# Altium footprint library Isengard.PcbLib: 150 footprints (part 9 of 10)
Each footprint in its own frame and in the unit in brackets; x right, y up, seen from the top. Pads: shape width x height; smd on the part's side, far side on the other; paste and mask are expansions set on the pad; w line width, h text height; cw(c..) or ccw(c..) is an arc to the next point about the centre after c.
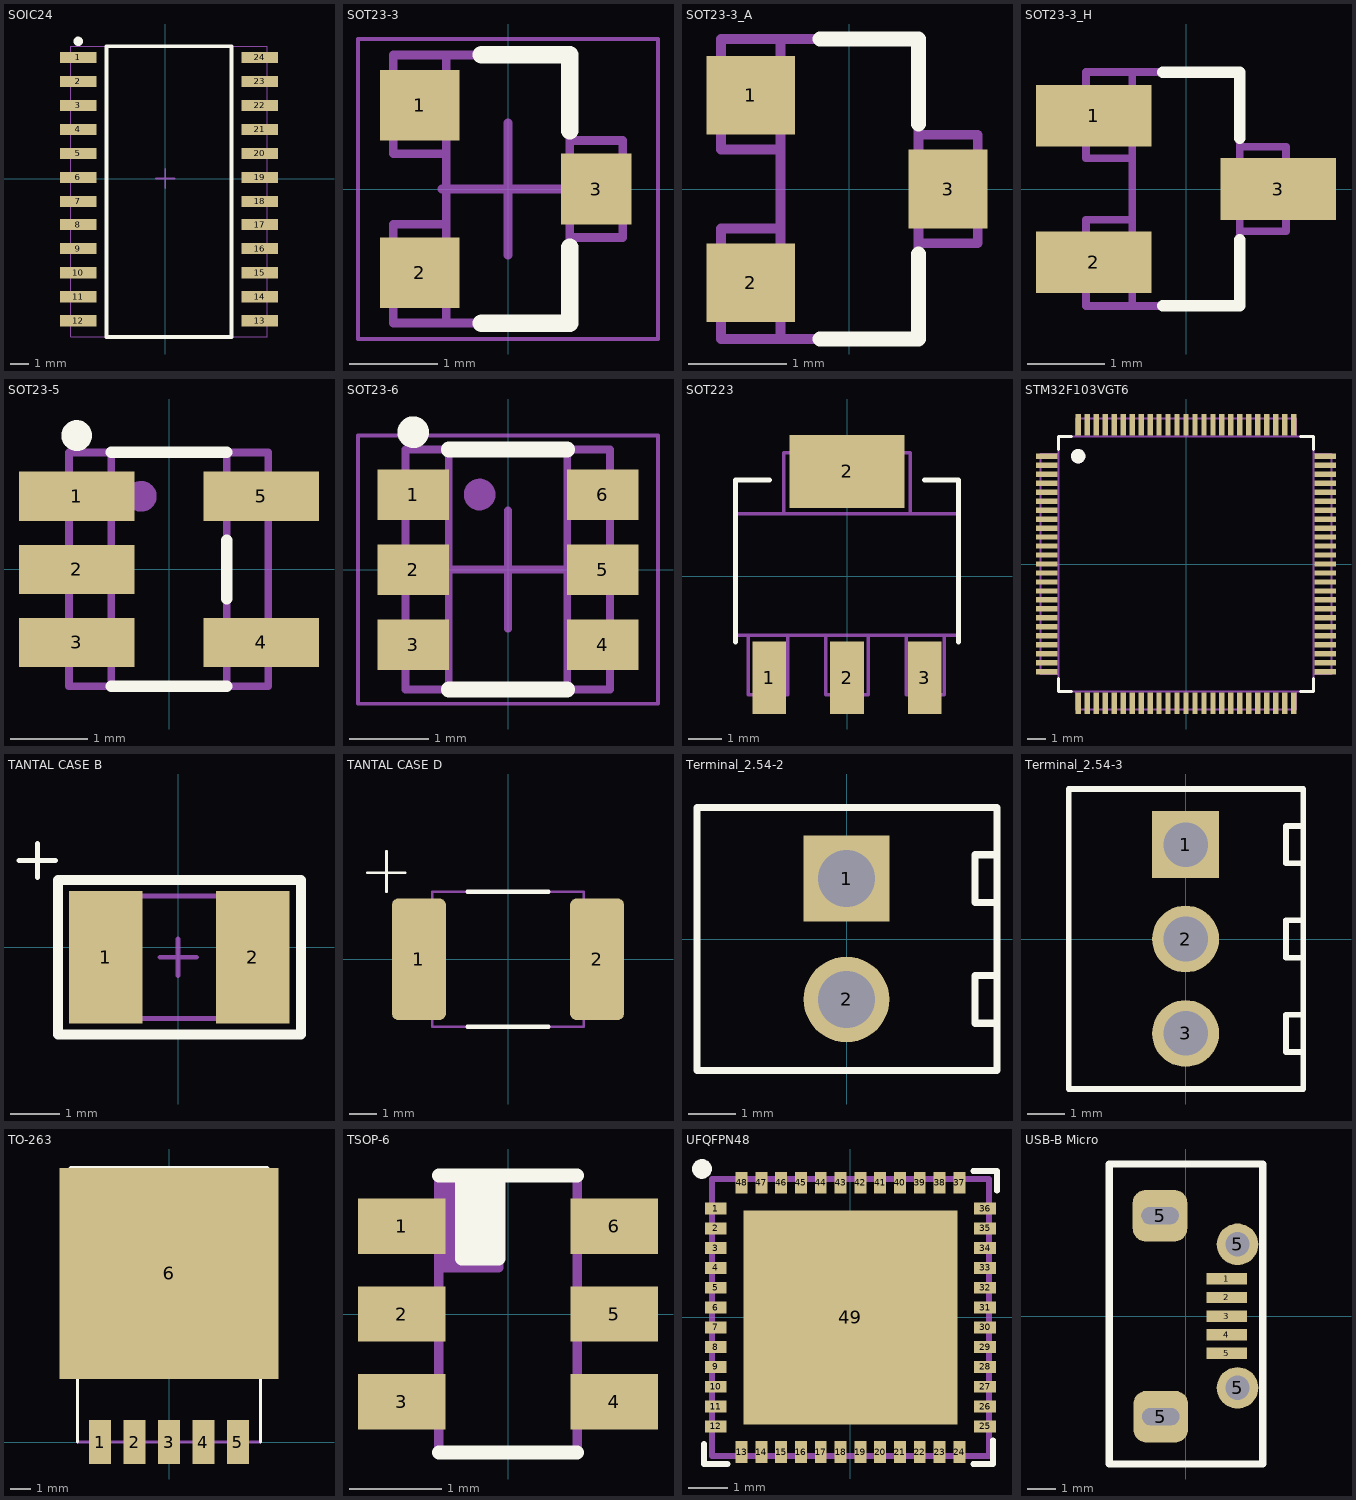
[diagram p8: the footprints below, top view; thin cyan lines are the x and y axes]

## SOIC24 [mm] "SOIC, 24-Leads, Body 15,4x7,6mm, Pitch 1,27mm, IPC Medium Density"
height 2.65
pads (24):
  rect 1.946x0.6 smd: 1(-4.6,6.41) 2(-4.6,5.14) 3(-4.6,3.87) 4(-4.6,2.6) 5(-4.6,1.33) 6(-4.6,0.06) 7(-4.6,-1.21) 8(-4.6,-2.43) 9(-4.6,-3.7) 10(-4.6,-4.97) 11(-4.6,-6.24) 12(-4.6,-7.51) 13(5,-7.51) 14(5,-6.24) 15(5,-4.97) 16(5,-3.7) 17(5,-2.43) 18(5,-1.21) 19(5,0.06) 20(5,1.33) 21(5,2.6) 22(5,3.87) 23(5,5.14) 24(5,6.41)
Top Overlay:
  circle w0.25: c-4.6,7.26 r0.125
  lines w0.2: -3.1,-8.375 -3.1,7 3.5,7 3.5,-8.375 -3.1,-8.375
Mechanical 9:
  text ".Comment" at -3.95,7.65 h0.6
  text ".Designator" at -4.425,8.325 h0.8
Mechanical 11:
  lines w0.05: -5,-8.375 -5,7 5.4,7 5.4,-8.375 -5,-8.375
  lines w0.1: -0.5,0 0.5,0 ; 0,-0.5 0,0.5
3D body "User Library-SOIC_24-300.STEP": height 2.6, standoff 0, extent -5,-8.4 5.4,7

## SOT23-3 [mm]
height 1.12
pads (3):
  rect 0.9x0.8 smd: 1(-1,0.95) 2(-1,-0.95)
  rect 0.8x0.8 smd: 3(1,0)
Top Overlay:
  lines w0.2: -0.3,-1.52 0.7,-1.52 0.7,-0.66 ; -0.3,1.52 0.7,1.52 0.7,0.66
Mechanical 9:
  text ".Comment" at -0.75,-0.5 h0.8
  text ".Designator" at -0.75,0.25 h1
Mechanical 11:
  lines w0.1: -0.7,-1.52 -0.7,1.52 ; -0.7,-0.4 -1.3,-0.4 -1.3,-1.52 0.7,-1.52 0.7,1.52 -1.3,1.52 -1.3,0.4 -0.7,0.4 ; 0.7,-0.55 1.3,-0.55 1.3,0.55 0.7,0.55
Mechanical 15:
  lines w0.05: -1.7,-1.7 -1.7,1.7 1.7,1.7 1.7,-1.7 -1.7,-1.7
  lines w0.1: -0.75,0 0.75,0 ; 0,-0.75 0,0.75
3D body "SOT-23-3.STEP": height 1.1, standoff 0, extent -1.15,-1.5 1.15,1.5

## SOT23-3_A [mm]
height 1.12
pads (3):
  rect 0.9x0.8 smd: 1(-1,0.95) 2(-1,-0.95)
  rect 0.8x0.8 smd: 3(1,0)
Top Overlay:
  lines w0.15: -0.3,-1.52 0.7,-1.52 0.7,-0.66 ; -0.3,1.52 0.7,1.52 0.7,0.66
Mechanical 9:
  text ".Comment" at -0.73,-2.2 h0.8
  text ".Designator" at -0.71,1.79 h0.8
Mechanical 11:
  lines w0.1: -0.7,-1.52 -0.7,1.52 ; -0.7,-0.4 -1.3,-0.4 -1.3,-1.52 0.7,-1.52 0.7,1.52 -1.3,1.52 -1.3,0.4 -0.7,0.4 ; 0.7,-0.55 1.3,-0.55 1.3,0.55 0.7,0.55
3D body "SOT-23-3.STEP": height 1.1, standoff 0, extent -1.15,-1.5 1.15,1.5

## SOT23-3_H [mm]
height 1.12
pads (3):
  rect 1.5x0.8 smd: 1(-1.2,0.95) 2(-1.2,-0.95) 3(1.2,0)
Top Overlay:
  lines w0.15: -0.3,-1.52 0.7,-1.52 0.7,-0.66 ; -0.3,1.52 0.7,1.52 0.7,0.66
Mechanical 7:
  lines w0.1: -0.7,-1.52 -0.7,1.52 ; -0.7,-0.4 -1.3,-0.4 -1.3,-1.52 0.7,-1.52 0.7,1.52 -1.3,1.52 -1.3,0.4 -0.7,0.4 ; 0.7,-0.55 1.3,-0.55 1.3,0.55 0.7,0.55
Mechanical 10:
  text ".Comment" at -0.74,-2.17 h0.6
  text ".Designator" at -0.71,1.79 h0.8
3D body "SOT-23-3.STEP": height 1.1, standoff 0, extent -1.15,-1.5 1.15,1.5

## SOT23-5 [mm]
height 1.12
pads (5):
  rect 1.5x0.64 smd: 1(-1.2,0.95) 2(-1.2,0) 3(-1.2,-0.95) 4(1.2,-0.95) 5(1.2,0.95)
Top Overlay:
  circle w0.2: c-1.2,1.74 r0.1
  lines w0.15: -0.75,-1.52 0.75,-1.52 ; -0.75,1.52 0.75,1.52 ; 0.75,-0.38 0.75,0.38
Mechanical 7:
  circle w0.2: c-0.36,0.95 r0.1
  lines w0.1: -0.75,-1.52 -0.75,1.52 ; 0.75,-1.52 0.75,1.52 ; -1.3,-1.52 1.29,-1.52 1.29,1.52 -1.3,1.52 -1.3,-1.52
Mechanical 10:
  text ".Designator" at -0.73,1.79 h0.8
  text ".Comment" at -0.95,-2.13 h0.6
3D body "User Library-SOT23-5-3.STEP": height 1.45, standoff 0.01, extent -1.6,-1.55 1.6,1.55

## SOT23-6 [mm]
height 1.12
pads (6):
  rect 0.9x0.64 smd: 1(-1.2,0.95) 2(-1.2,0) 3(-1.2,-0.95) 4(1.2,-0.95) 5(1.2,0) 6(1.2,0.95)
Top Overlay:
  circle w0.2: c-1.2,1.74 r0.1
  lines w0.2: -0.75,-1.52 0.75,-1.52 ; -0.75,1.52 0.75,1.52
Mechanical 9:
  text ".Comment" at -1,-0.75 h0.8
  text ".Designator" at -1,0.25 h1
Mechanical 11:
  circle w0.2: c-0.36,0.95 r0.1
  lines w0.1: -0.75,-1.52 -0.75,1.52 ; 0.75,-1.52 0.75,1.52 ; -1.3,-1.52 1.29,-1.52 1.29,1.52 -1.3,1.52 -1.3,-1.52
Mechanical 15:
  lines w0.05: -1.9,-1.7 1.9,-1.7 1.9,1.7 -1.9,1.7 -1.9,-1.7
  lines w0.1: -0.75,0 0.75,0 ; 0,-0.75 0,0.75
3D body "SW3dPS-SOT-23-6.STEP": height 1.09, standoff 0, extent -1.126,-1.397 1.3,1.397

## SOT223 [mm]
pads (4):
  rect 1x2.15 smd: 1(-2.3,-3) 2(0,-3) 3(2.3,-3)
  rect 3.4x2.15 smd: 2(0,3.1)
Top Overlay:
  lines w0.15: -3.3,-1.95 -3.3,2.85 -2.3,2.85 ; 2.3,2.85 3.3,2.85 3.3,-1.95
Mechanical 7:
  lines w0.1: -2.9,-1.75 -2.925,-1.775 -2.925,-3.5 -1.75,-3.5 -1.75,-1.75 ; -1.875,1.875 -1.875,3.65 1.875,3.65 1.875,1.85 ; -0.625,-1.75 -0.625,-3.5 0.625,-3.5 0.625,-1.75 ; 1.75,-1.75 1.75,-3.5 2.875,-3.5 2.875,-1.75 ; -3.3,-1.75 -3.3,1.85 3.3,1.85 3.3,-1.75 -3.3,-1.75
3D body "CircuitWorks-SOT-223.step": height 1.67, standoff -0.01, extent -3.25,-3.38 3.25,3.58

## STM32F103VGT6 [mm] "Микроконтроллер"
pads (100):
  rect 1.2x0.3 smd: 1(-7.75,6) 2(-7.75,5.5) 3(-7.75,5) 4(-7.75,4.5) 5(-7.75,4) 6(-7.75,3.5) 7(-7.75,3) 8(-7.75,2.5) 9(-7.75,2) 10(-7.75,1.5) 11(-7.75,1) 12(-7.75,0.5) 13(-7.75,0) 14(-7.75,-0.5) 15(-7.75,-1) 16(-7.75,-1.5) 17(-7.75,-2) 18(-7.75,-2.5) 19(-7.75,-3) 20(-7.75,-3.5) 21(-7.75,-4) 22(-7.75,-4.5) 23(-7.75,-5) 24(-7.75,-5.5) 25(-7.75,-6) 51(7.75,-6) 52(7.75,-5.5) 53(7.75,-5) 54(7.75,-4.5) 55(7.75,-4) 56(7.75,-3.5) 57(7.75,-3) 58(7.75,-2.5) 59(7.75,-2) 60(7.75,-1.5) 61(7.75,-1) 62(7.75,-0.5) 63(7.75,0) 64(7.75,0.5) 65(7.75,1) 66(7.75,1.5) 67(7.75,2) 68(7.75,2.5) 69(7.75,3) 70(7.75,3.5) 71(7.75,4) 72(7.75,4.5) 73(7.75,5) 74(7.75,5.5) 75(7.75,6)
  rect 0.3x1.2 smd: 26(-6,-7.75) 27(-5.5,-7.75) 28(-5,-7.75) 29(-4.5,-7.75) 30(-4,-7.75) 31(-3.5,-7.75) 32(-3,-7.75) 33(-2.5,-7.75) 34(-2,-7.75) 35(-1.5,-7.75) 36(-1,-7.75) 37(-0.5,-7.75) 38(0,-7.75) 39(0.5,-7.75) 40(1,-7.75) 41(1.5,-7.75) 42(2,-7.75) 43(2.5,-7.75) 44(3,-7.75) 45(3.5,-7.75) 46(4,-7.75) 47(4.5,-7.75) 48(5,-7.75) 49(5.5,-7.75) 50(6,-7.75) 76(6,7.75) 77(5.5,7.75) 78(5,7.75) 79(4.5,7.75) 80(4,7.75) 81(3.5,7.75) 82(3,7.75) 83(2.5,7.75) 84(2,7.75) 85(1.5,7.75) 86(1,7.75) 87(0.5,7.75) 88(0,7.75) 89(-0.5,7.75) 90(-1,7.75) 91(-1.5,7.75) 92(-2,7.75) 93(-2.5,7.75) 94(-3,7.75) 95(-3.5,7.75) 96(-4,7.75) 97(-4.5,7.75) 98(-5,7.75) 99(-5.5,7.75) 100(-6,7.75)
Top Overlay:
  circle w0.4: c-6,6 r0.2
  lines w0.15: -7.1,-6.375 -7.1,-7.1 -6.375,-7.1 ; -7.1,6.375 -7.1,7.1 -6.375,7.1 ; 6.375,-7.1 7.1,-7.1 7.1,-6.375 ; 6.375,7.1 7.1,7.1 7.1,6.375
Mechanical 7:
  circle w0.4: c-6,6 r0.2
  lines w0.1: -7.1,-6.135 -8.1,-6.135 -8.1,6.135 -7.1,6.135 ; -6.135,-7.1 -6.135,-8.1 6.135,-8.1 6.135,-7.1 ; -6.135,7.1 -6.135,8.1 6.135,8.1 6.135,7.1 ; 7.1,-6.135 8.1,-6.135 8.1,6.135 7.1,6.135 ; -7.1,-7.1 -7.1,7.1 7.1,7.1 7.1,-7.1 -7.1,-7.1
Mechanical 10:
  text ".Comment" at -1.08,-0.495 h0.6
  text ".Designator" at -1.2,0.155 h0.8
3D body: height 1.6, standoff 0, extent -7.1,-7.1 7.1,7.1
3D body: height 0.9, standoff 0, extent -6.135,7.1 6.135,8.1
3D body: height 0.9, standoff 0, extent -8.1,-6.135 -7.1,6.135
3D body: height 0.9, standoff 0, extent 7.1,-6.135 8.1,6.135
3D body: height 0.9, standoff 0, extent -6.135,-8.1 6.135,-7.1

## TANTAL CASE B [mm] "Конденсатор электролитический танталовый"
height 2.5
pads (2):
  rect 1.5x2.7 smd: 1(-1.475,-0.2) 2(1.525,-0.2)
Top Overlay:
  lines w0.1: -3.25,1.775 -2.5,1.775 ; -2.875,1.425 -2.875,2.125
  lines w0.2: -2.455,-1.78 -2.455,1.38 2.505,1.38 2.505,-1.78 -2.455,-1.78
Mechanical 9:
  text ".Comment" at -1.25,-0.75 h0.8
  text ".Designator" at -1.25,0 h1
Mechanical 11:
  lines w0.1: -1.575,-1.45 1.625,-1.45 1.625,1.05 -1.575,1.05 -1.575,-1.45
Mechanical 15:
  lines w0.05: -2.455,-1.78 2.505,-1.78 2.505,1.38 -2.455,1.38 -2.455,-1.78
  lines w0.1: -0.375,-0.2 0.375,-0.2 ; 0,-0.575 0,0.175
3D body "User Library-CaseB_3528-21.step": height 1.9, standoff 0, extent -1.7,-1.6 1.8,1.2

## TANTAL CASE D [mm] "Конденсатор танталовый SMD"
height 1.8
pads (2):
  rrect25% 2.01x4.51 smd: 1(-3.3,0) 2(3.3,0)
Top Overlay:
  lines w0.1: -5.2,3.2 -3.8,3.2 ; -4.5,2.5 -4.5,4
  lines w0.15: -1.5,-2.5 1.5,-2.5 ; -1.5,2.5 1.5,2.5
Mechanical 7:
  lines w0.1: -2.8,-2.5 -2.8,2.5 2.8,2.5 2.8,-2.5 -2.8,-2.5
Mechanical 10:
  text ".Designator" at -0.56,3.04 h0.8
  text ".Comment" at -0.47,-3.45 h0.6
3D body "User Library-CAP_TANT_7343-40.step": height 4.1, standoff 0.1, extent -3.8,-2.3 3.8,2.3

## Terminal_2.54-2 [mm]
height 8.5
pads (2):
  rect 1.8x1.8 hole 1.2: 1(0,1.27)
  round 1.8 hole 1.2: 2(0,-1.27)
Top Overlay:
  lines w0.15: 3.16,-1.77 2.7,-1.77 2.7,-0.77 3.16,-0.77 ; 3.16,0.77 2.7,0.77 2.7,1.77 3.16,1.77 ; -3.14,-2.765 -3.14,2.765 3.16,2.765 3.16,-2.765 -3.14,-2.765
Mechanical 9:
  text ".Comment" at -1.15,3.275 h0.6
  text ".Designator" at -1.175,3.975 h0.8
Mechanical 11:
  lines w0.1: 3.16,-1.77 2.7,-1.77 2.7,-0.77 3.16,-0.77 ; 3.16,0.77 2.7,0.77 2.7,1.77 3.16,1.77 ; -3.14,-2.765 3.16,-2.765 3.16,2.765 -3.14,2.765 -3.14,-2.765
3D body "terminal 2_54x2.STEP": height 8.5, standoff -3.5, extent -3.075,-2.775 3.125,2.765

## Terminal_2.54-3 [mm]
height 8.5
pads (3):
  rect 1.8x1.8 hole 1.2: 1(0,2.54)
  round 1.8 hole 1.2: 2(0,0) 3(0,-2.54)
Top Overlay:
  lines w0.15: 3.16,-3.04 2.7,-3.04 2.7,-2.04 3.16,-2.04 ; 3.16,-0.5 2.7,-0.5 2.7,0.5 3.16,0.5 ; 3.16,2.04 2.7,2.04 2.7,3.04 3.16,3.04 ; -3.14,-4.035 -3.14,4.035 3.16,4.035 3.16,-4.035 -3.14,-4.035
Mechanical 7:
  lines w0.1: 3.16,-3.04 2.7,-3.04 2.7,-2.04 3.16,-2.04 ; 3.16,-0.5 2.7,-0.5 2.7,0.5 3.16,0.5 ; 3.16,2.04 2.7,2.04 2.7,3.04 3.16,3.04 ; -3.14,-4.035 3.16,-4.035 3.16,4.035 -3.14,4.035 -3.14,-4.035
Mechanical 10:
  text ".Comment" at -1.15,4.545 h0.6
  text ".Designator" at -1.175,5.245 h0.8
3D body: height 8.5, standoff 0, extent -3.14,-4.035 3.16,4.035

## TO-263 [mm]
pads (6):
  rect 1.07x2.16 smd: 1(-3.4,0) 2(-1.7,0) 3(0,0) 4(1.7,0) 5(3.4,0)
  rect 10.8x10.41 smd: 6(0,8.315)
Top Overlay:
  lines w0.15: -5.258,12.27 5.232,12.27 ; -4.51,0 -4.51,3.7 ; 4.51,0 4.51,3.7 ; -5.258,3.7 5.232,3.7 5.232,13.168 4.86,13.54 -4.86,13.54 -5.258,13.142 -5.258,3.7
Mechanical 7:
  lines w0.15: -5.25,12.27 -5.25,3.7 5.25,3.7 5.25,12.27 ; -4.51,3.7 -4.51,0 4.51,0 4.51,3.7 ; -5.1,12.27 -5.1,12.4 -3.96,13.54 3.962,13.54 5.232,12.27 -5.1,12.27
Mechanical 10:
  text ".Comment" at -1.3,17 h0.7
  text ".Designator" at -1.3,-2.8 h0.7
3D body "TS5B.STEP": height 4.58, standoff 0, extent -5.08,-0.9 5.1,13.45

## TSOP-6 [mm]
height 1
pads (6):
  rect 0.95x0.6 smd mask+0: 1(-1.15,0.95) 2(-1.15,0) 3(-1.15,-0.95) 4(1.15,-0.95) 5(1.15,0) 6(1.15,0.95)
Top Overlay:
  rectangle: -0.5,0.6 -0.1,1.5
  lines w0.15: -0.75,-1.5 0.75,-1.5 ; -0.75,1.5 0.75,1.5 ; -0.5,1.5 -0.5,0.6 -0.1,0.6 -0.1,1.5
Mechanical 7:
  rectangle: -0.75,0.5 -0.1,1.5
  lines w0.1: -0.75,0.5 -0.1,0.5 -0.1,1.5 ; 0.7,1.5 -0.75,1.5 -0.75,-1.5 0.75,-1.5 0.75,1.5
Mechanical 10:
  text ".Designator" at -1.1,1.8 h0.8
  text ".Comment" at -0.9,-2.1 h0.6
3D body: height 1, standoff 0, extent -0.8,-1.5 0.8,1.5

## UFQFPN48 [mm]
pads (49):
  rect 0.55x0.3 smd: 1(-3.4,2.75) 2(-3.4,2.25) 3(-3.4,1.75) 4(-3.4,1.25) 5(-3.4,0.75) 6(-3.4,0.25) 7(-3.4,-0.25) 8(-3.4,-0.75) 9(-3.4,-1.25) 10(-3.4,-1.75) 11(-3.4,-2.25) 12(-3.4,-2.75) 25(3.4,-2.75) 26(3.4,-2.25) 27(3.4,-1.75) 28(3.4,-1.25) 29(3.4,-0.75) 30(3.4,-0.25) 31(3.4,0.25) 32(3.4,0.75) 33(3.4,1.25) 34(3.4,1.75) 35(3.4,2.25) 36(3.4,2.75)
  rect 0.3x0.55 smd: 13(-2.75,-3.4) 14(-2.25,-3.4) 15(-1.75,-3.4) 16(-1.25,-3.4) 17(-0.75,-3.4) 18(-0.25,-3.4) 19(0.25,-3.4) 20(0.75,-3.4) 21(1.25,-3.4) 22(1.75,-3.4) 23(2.25,-3.4) 24(2.75,-3.4) 37(2.75,3.4) 38(2.25,3.4) 39(1.75,3.4) 40(1.25,3.4) 41(0.75,3.4) 42(0.25,3.4) 43(-0.25,3.4) 44(-0.75,3.4) 45(-1.25,3.4) 46(-1.75,3.4) 47(-2.25,3.4) 48(-2.75,3.4)
  rect 5.4x5.4 smd: 49(0,0)
Top Overlay:
  circle w0.25: c-3.75,3.75 r0.125
  lines w0.15: -3.7,-3.2 -3.7,-3.7 -3.1,-3.7 ; 3.1,-3.7 3.6,-3.7 3.6,-3.1 ; 3.1,3.7 3.7,3.7 3.7,3.2
Mechanical 7:
  lines w0.15: -3.5,-3.5 3.5,-3.5 3.5,3.5 -3.5,3.5 -3.5,-3.5
3D body: height 0.6, standoff 0, extent -3.5,-3.5 3.5,3.5

## USB-B Micro [mm]
pads (9):
  rect 1.4x0.4 smd: 1(1.425,1.3) 2(1.425,0.65) 3(1.425,0) 4(1.425,-0.65) 5(1.425,-1.3)
  rrect50% 1.9x1.8 hole 0.6 slot 1.3 at 0 deg: 5(-0.9,3.5) 5(-0.875,-3.5)
  round 1.45 hole 0.85: 5(1.8,-2.5) 5(1.8,2.5)
Top Overlay:
  lines w0.254: -2.665,-5.15 2.675,-5.15 2.675,5.3 -2.665,5.3 -2.665,-5.15
3D body "User Library-MicroUSB-B_Molex_105017-0001.step": height 2.66, standoff -0.64, extent -3.505,-4.1 1.925,4.1